# Altium footprint library 8PIN_Relay.PcbLib: 1 footprints
Each footprint in its own frame and in the unit in brackets; x right, y up, seen from the top. Pads: shape width x height; smd on the part's side, far side on the other; paste and mask are expansions set on the pad; w line width, h text height; cw(c..) or ccw(c..) is an arc to the next point about the centre after c.
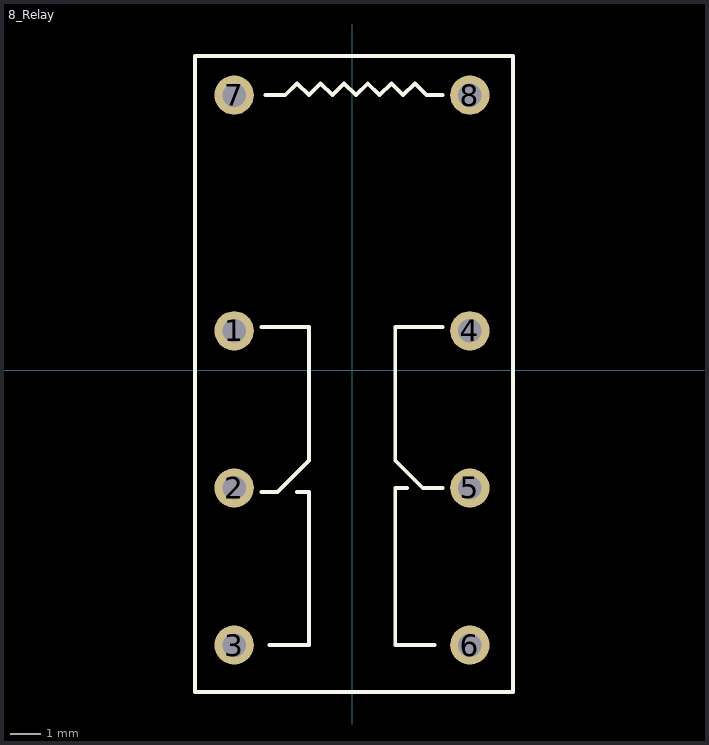
[diagram p0: the footprint, top view; thin cyan lines are the x and y axes]

## 8_Relay [mil] "8PIN继电器"
pads (8):
  round 50 hole 30: 1(-150,50) 2(-150,-150) 3(-150,-350) 4(150,50) 5(150,-150) 6(150,-350) 7(-150,350) 8(150,350)
Top Overlay:
  lines w5: -115,-155 -95,-155 -55,-115 -55,55 -115,55 ; -110,350 -85,350 -70,365 -55,350 -40,365 -25,350 -10,365 5,350 20,365 35,350 50,365 65,350 80,365 95,350 115,350 ; -105,-350 -55,-350 -55,-155 -70,-155 ; 70,-150 55,-150 55,-350 105,-350 ; 115,-150 90,-150 55,-115 55,55 115,55 ; -200,-410 205,-410 205,400 -200,400 -200,-410